# Altium footprint library Connectors.PcbLib: 120 footprints (part 5 of 8)
Each footprint in its own frame and in the unit in brackets; x right, y up, seen from the top. Pads: shape width x height; smd on the part's side, far side on the other; paste and mask are expansions set on the pad; w line width, h text height; cw(c..) or ccw(c..) is an arc to the next point about the centre after c.
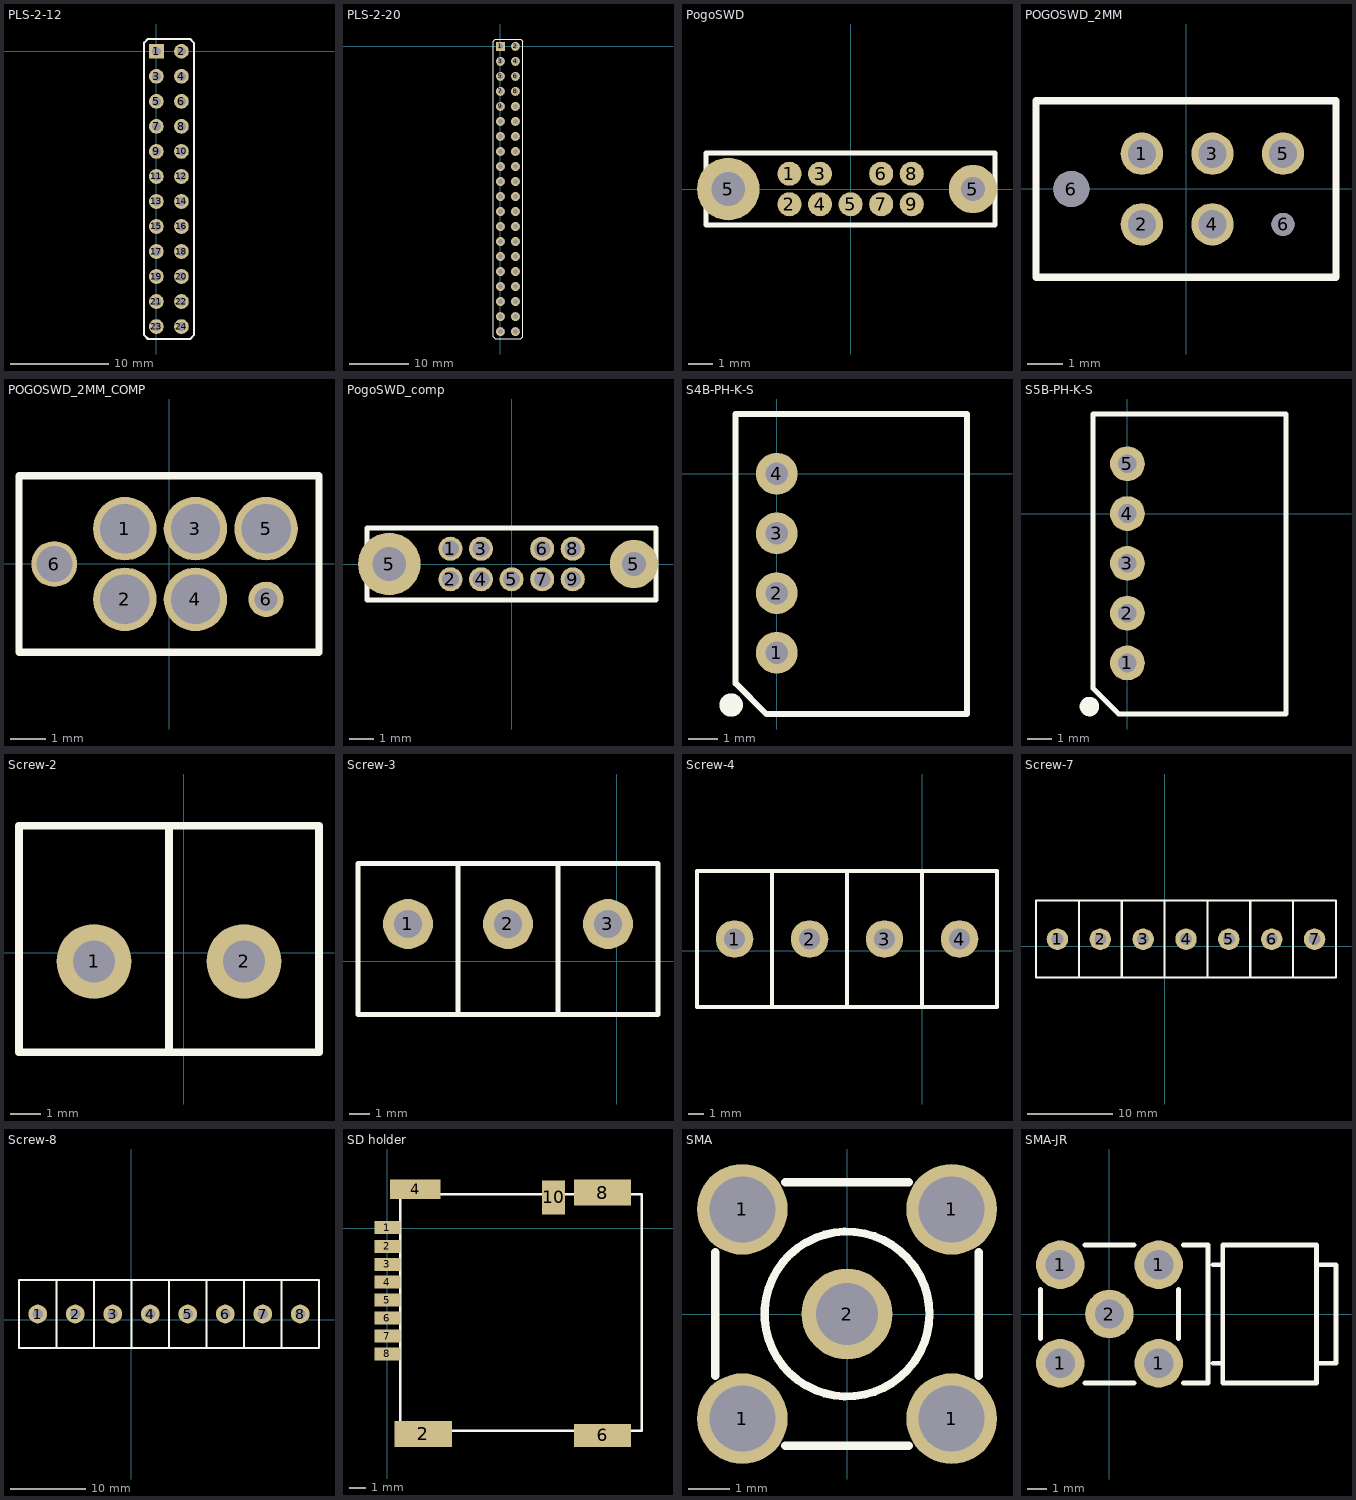
[diagram p4: the footprints below, top view; thin cyan lines are the x and y axes]

## PLS-2-12 [mm]
pads (24):
  rect 1.5x1.5 hole 0.9: 1(0,0)
  round 1.5 hole 0.9: 2(2.54,0) 3(0,-2.54) 4(2.54,-2.54) 5(0,-5.08) 6(2.54,-5.08) 7(0,-7.62) 8(2.54,-7.62) 9(0,-10.16) 10(2.54,-10.16) 11(0,-12.7) 12(2.54,-12.7) 13(0,-15.24) 14(2.54,-15.24) 15(0,-17.78) 16(2.54,-17.78) 17(0,-20.32) 18(2.54,-20.32) 19(0,-22.86) 20(2.54,-22.86) 21(0,-25.4) 22(2.54,-25.4) 23(0,-27.94) 24(2.54,-27.94)
Top Overlay:
  lines w0.2: -1.25,-28.8 -1.25,0.875 -0.875,1.25 3.425,1.25 3.81,0.865 3.81,-28.815 3.425,-29.2 -0.85,-29.2 -1.25,-28.8
3D body "User Library-PLS-1.STEP": height 8.44, standoff -3, extent 1.27,-29.21 3.81,-26.67
3D body "User Library-PLS-1.STEP": height 8.44, standoff -3, extent -1.27,-29.21 1.27,-26.67
3D body "User Library-PLS-1.STEP": height 8.44, standoff -3, extent 1.27,-26.67 3.81,-24.13
3D body "User Library-PLS-1.STEP": height 8.44, standoff -3, extent -1.27,-26.67 1.27,-24.13
3D body "User Library-PLS-1.STEP": height 8.44, standoff -3, extent 1.27,-24.13 3.81,-21.59
3D body "User Library-PLS-1.STEP": height 8.44, standoff -3, extent -1.27,-24.13 1.27,-21.59
3D body "User Library-PLS-1.STEP": height 8.44, standoff -3, extent 1.27,-21.59 3.81,-19.05
3D body "User Library-PLS-1.STEP": height 8.44, standoff -3, extent -1.27,-21.59 1.27,-19.05
3D body "User Library-PLS-1.STEP": height 8.44, standoff -3, extent 1.27,-19.05 3.81,-16.51
3D body "User Library-PLS-1.STEP": height 8.44, standoff -3, extent -1.27,-19.05 1.27,-16.51
3D body "User Library-PLS-1.STEP": height 8.44, standoff -3, extent 1.27,-16.51 3.81,-13.97
3D body "User Library-PLS-1.STEP": height 8.44, standoff -3, extent -1.27,-16.51 1.27,-13.97
3D body "User Library-PLS-1.STEP": height 8.44, standoff -3, extent 1.27,-13.97 3.81,-11.43
3D body "User Library-PLS-1.STEP": height 8.44, standoff -3, extent -1.27,-13.97 1.27,-11.43
3D body "User Library-PLS-1.STEP": height 8.44, standoff -3, extent 1.27,-11.43 3.81,-8.89
3D body "User Library-PLS-1.STEP": height 8.44, standoff -3, extent -1.27,-11.43 1.27,-8.89
3D body "User Library-PLS-1.STEP": height 8.44, standoff -3, extent 1.27,-8.89 3.81,-6.35
3D body "User Library-PLS-1.STEP": height 8.44, standoff -3, extent -1.27,-8.89 1.27,-6.35
3D body "User Library-PLS-1.STEP": height 8.44, standoff -3, extent 1.27,-6.35 3.81,-3.81
3D body "User Library-PLS-1.STEP": height 8.44, standoff -3, extent -1.27,-6.35 1.27,-3.81
3D body "User Library-PLS-1.STEP": height 8.44, standoff -3, extent 1.27,-3.81 3.81,-1.27
3D body "User Library-PLS-1.STEP": height 8.44, standoff -3, extent -1.27,-3.81 1.27,-1.27
3D body "User Library-PLS-1.STEP": height 8.44, standoff -3, extent 1.27,-1.27 3.81,1.27
3D body "User Library-PLS-1.STEP": height 8.44, standoff -3, extent -1.27,-1.27 1.27,1.27

## PLS-2-20 [mm]
pads (40):
  rect 1.5x1.5 hole 0.9: 1(0,0)
  round 1.5 hole 0.9: 2(2.54,0) 3(0,-2.54) 4(2.54,-2.54) 5(0,-5.08) 6(2.54,-5.08) 7(0,-7.62) 8(2.54,-7.62) 9(0,-10.16) 10(2.54,-10.16) 11(0,-12.7) 12(2.54,-12.7) 13(0,-15.24) 14(2.54,-15.24) 15(0,-17.78) 16(2.54,-17.78) 17(0,-20.32) 18(2.54,-20.32) 19(0,-22.86) 20(2.54,-22.86) 21(0,-25.4) 22(2.54,-25.4) 23(0,-27.94) 24(2.54,-27.94) 25(0,-30.475) 26(2.54,-30.475) 27(0,-33.015) 28(2.54,-33.015) 29(0,-35.555) 30(2.54,-35.555) 31(0,-38.095) 32(2.54,-38.095) 33(0,-40.635) 34(2.54,-40.635) 35(0,-43.175) 36(2.54,-43.175) 37(0,-45.715) 38(2.54,-45.715) 39(0,-48.255) 40(2.54,-48.255)
Top Overlay:
  lines w0.2: -1.25,-49.115 -0.85,-49.515 3.425,-49.515 3.81,-49.13 3.81,-28.815 3.81,0.865 3.425,1.25 -0.875,1.25 -1.25,0.875 -1.25,-28.8 -1.25,-49.115
3D body "User Library-PLS-1.STEP": height 8.44, standoff -3, extent 1.27,-29.21 3.81,-26.67
3D body "User Library-PLS-1.STEP": height 8.44, standoff -3, extent -1.27,-29.21 1.27,-26.67
3D body "User Library-PLS-1.STEP": height 8.44, standoff -3, extent 1.27,-26.67 3.81,-24.13
3D body "User Library-PLS-1.STEP": height 8.44, standoff -3, extent -1.27,-26.67 1.27,-24.13
3D body "User Library-PLS-1.STEP": height 8.44, standoff -3, extent 1.27,-24.13 3.81,-21.59
3D body "User Library-PLS-1.STEP": height 8.44, standoff -3, extent -1.27,-24.13 1.27,-21.59
3D body "User Library-PLS-1.STEP": height 8.44, standoff -3, extent 1.27,-21.59 3.81,-19.05
3D body "User Library-PLS-1.STEP": height 8.44, standoff -3, extent -1.27,-21.59 1.27,-19.05
3D body "User Library-PLS-1.STEP": height 8.44, standoff -3, extent 1.27,-19.05 3.81,-16.51
3D body "User Library-PLS-1.STEP": height 8.44, standoff -3, extent -1.27,-19.05 1.27,-16.51
3D body "User Library-PLS-1.STEP": height 8.44, standoff -3, extent 1.27,-16.51 3.81,-13.97
3D body "User Library-PLS-1.STEP": height 8.44, standoff -3, extent -1.27,-16.51 1.27,-13.97
3D body "User Library-PLS-1.STEP": height 8.44, standoff -3, extent 1.27,-13.97 3.81,-11.43
3D body "User Library-PLS-1.STEP": height 8.44, standoff -3, extent -1.27,-13.97 1.27,-11.43
3D body "User Library-PLS-1.STEP": height 8.44, standoff -3, extent 1.27,-11.43 3.81,-8.89
3D body "User Library-PLS-1.STEP": height 8.44, standoff -3, extent -1.27,-11.43 1.27,-8.89
3D body "User Library-PLS-1.STEP": height 8.44, standoff -3, extent 1.27,-8.89 3.81,-6.35
3D body "User Library-PLS-1.STEP": height 8.44, standoff -3, extent -1.27,-8.89 1.27,-6.35
3D body "User Library-PLS-1.STEP": height 8.44, standoff -3, extent 1.27,-6.35 3.81,-3.81
3D body "User Library-PLS-1.STEP": height 8.44, standoff -3, extent -1.27,-6.35 1.27,-3.81
3D body "User Library-PLS-1.STEP": height 8.44, standoff -3, extent 1.27,-3.81 3.81,-1.27
3D body "User Library-PLS-1.STEP": height 8.44, standoff -3, extent -1.27,-3.81 1.27,-1.27
3D body "User Library-PLS-1.STEP": height 8.44, standoff -3, extent 1.27,-1.27 3.81,1.27
3D body "User Library-PLS-1.STEP": height 8.44, standoff -3, extent -1.27,-1.27 1.27,1.27
3D body "User Library-PLS-1.STEP": height 8.44, standoff -3, extent -1.27,-31.745 1.27,-29.205
3D body "User Library-PLS-1.STEP": height 8.44, standoff -3, extent 1.27,-31.745 3.81,-29.205
3D body "User Library-PLS-1.STEP": height 8.44, standoff -3, extent -1.27,-34.285 1.27,-31.745
3D body "User Library-PLS-1.STEP": height 8.44, standoff -3, extent 1.27,-34.285 3.81,-31.745
3D body "User Library-PLS-1.STEP": height 8.44, standoff -3, extent -1.27,-36.825 1.27,-34.285
3D body "User Library-PLS-1.STEP": height 8.44, standoff -3, extent 1.27,-36.825 3.81,-34.285
3D body "User Library-PLS-1.STEP": height 8.44, standoff -3, extent -1.27,-39.365 1.27,-36.825
3D body "User Library-PLS-1.STEP": height 8.44, standoff -3, extent 1.27,-39.365 3.81,-36.825
3D body "User Library-PLS-1.STEP": height 8.44, standoff -3, extent -1.27,-41.905 1.27,-39.365
3D body "User Library-PLS-1.STEP": height 8.44, standoff -3, extent 1.27,-41.905 3.81,-39.365
3D body "User Library-PLS-1.STEP": height 8.44, standoff -3, extent -1.27,-44.445 1.27,-41.905
3D body "User Library-PLS-1.STEP": height 8.44, standoff -3, extent 1.27,-44.445 3.81,-41.905
3D body "User Library-PLS-1.STEP": height 8.44, standoff -3, extent -1.27,-46.985 1.27,-44.445
3D body "User Library-PLS-1.STEP": height 8.44, standoff -3, extent 1.27,-46.985 3.81,-44.445
3D body "User Library-PLS-1.STEP": height 8.44, standoff -3, extent -1.27,-49.525 1.27,-46.985
3D body "User Library-PLS-1.STEP": height 8.44, standoff -3, extent 1.27,-49.525 3.81,-46.985

## PogoSWD [mm]
pads (11):
  round 1 smd: 1(-2.54,0.635) 2(-2.54,-0.635) 3(-1.27,0.635) 4(-1.27,-0.635) 5(0,-0.635) 6(1.27,0.635) 7(1.27,-0.635) 8(2.54,0.635) 9(2.54,-0.635)
  round 2.6 hole 1.4 paste+0 mask+0: 5(-5.08,0)
  round 2 hole 1 paste+0 mask+0: 5(5.08,0)
Top Overlay:
  lines w0.2: -6,-1.5 6,-1.5 6,1.5 -6,1.5 -6,-1.5

## POGOSWD_2MM [mm]
pads (7):
  round 1.2 hole 0.8: 1(-1.25,1) 2(-1.25,-1) 3(0.75,1) 4(0.75,-1) 5(2.75,1)
  round 1.02 hole 1.02 unplated mask+0: 6(-3.25,0)
  round 0.65 hole 0.65 unplated mask+0: 6(2.75,-1)
Top Overlay:
  lines w0.2: -4.25,-2.5 4.25,-2.5 4.25,2.5 -4.25,2.5 -4.25,-2.5

## POGOSWD_2MM_COMP [mm]
pads (7):
  round 1.8 hole 1.4: 1(-1.25,1) 2(-1.25,-1) 3(0.75,1) 4(0.75,-1) 5(2.75,1)
  round 1.3 hole 1.02: 6(-3.25,0)
  round 1 hole 0.65: 6(2.75,-1)
Top Overlay:
  lines w0.2: -4.25,-2.5 -4.25,2.5 4.25,2.5 4.25,-2.5 -4.25,-2.5

## PogoSWD_comp [mm] "Footprint for PogoSWD board"
pads (11):
  round 1 hole 0.7: 1(-2.54,0.635) 2(-2.54,-0.635) 3(-1.27,0.635) 4(-1.27,-0.635) 5(0,-0.635) 6(1.27,0.635) 7(1.27,-0.635) 8(2.54,0.635) 9(2.54,-0.635)
  round 2.6 hole 1.4 paste+0 mask+0: 5(-5.08,0)
  round 2 hole 1 paste+0 mask+0: 5(5.08,0)
Top Overlay:
  lines w0.2: -6,-1.5 -6,1.5 6,1.5 6,-1.5 -6,-1.5

## S4B-PH-K-S [mm] "JST S4B-PH-K-S connector"
pads (4):
  round 1.4 hole 0.75: 1(0,-6) 2(0,-4) 3(0,-2) 4(0,0)
Top Overlay:
  circle w0.5: c-1.525,-7.75 r0.141
  lines w0.2: -1.375,-7.025 -1.375,2 6.375,2 6.375,-8.05 -0.35,-8.05 -1.375,-7.025
3D body "S4B-PH-K-S.STEP": height 4.8, standoff -3.4, extent -1.325,-7.95 6.275,1.95

## S5B-PH-K-S [mm] "JST S5B-PH-K-S connector"
pads (5):
  round 1.4 hole 0.75: 1(0,-6) 2(0,-4) 3(0,-2) 4(0,0) 5(0,2)
Top Overlay:
  circle w0.5: c-1.525,-7.75 r0.141
  lines w0.2: -1.375,-7.025 -1.375,4 6.375,4 6.375,-8.05 -0.35,-8.05 -1.375,-7.025
3D body "S5B-PH-K-S.STEP": height 4.8, standoff -3.4, extent -1.3,-7.95 6.3,3.95

## Screw-2 [mm]
pads (2):
  round 2.5 hole 1.4: 1(-3,-0.3) 2(2,-0.3)
Top Overlay:
  lines w0.254: -0.5,-3.325 -0.5,4.2 ; -5.5,-3.325 -5.5,4.225 4.5,4.225 4.5,-3.325 -5.5,-3.325
3D body "User Library-Terminal-Screw-3A-2way.STEP": height 10, standoff -3, extent -6.075,-3.3 4.525,4.3

## Screw-3 [mm]
pads (3):
  round 2.5 hole 1.4: 1(-10.45,1.875) 2(-5.45,1.875) 3(-0.45,1.875)
Top Overlay:
  lines w0.254: -7.95,-2.625 -7.95,4.9 ; -2.95,-2.6 -2.95,4.9 ; -12.95,-2.65 2.05,-2.65 2.05,4.9 -12.95,4.9 -12.95,-2.65
3D body "User Library-Terminal-Screw-3A-3way.step": height 10, standoff -3, extent -12.95,-2.7 2.65,4.9

## Screw-4 [mm]
pads (4):
  round 2.5 hole 1.4: 1(-12.5,0.8) 2(-7.5,0.8) 3(-2.5,0.8) 4(2.5,0.8)
Top Overlay:
  lines w0.254: -10,-3.7 -10,5.3 ; 0,-3.7 0,5.3 ; -5,-3.725 -15,-3.725 -15,5.325 -5,5.325 ; -5,-3.725 -5,5.325 ; -5,-3.725 5,-3.725 5,5.325 -5,5.325 ; -5,-3.725 -5,5.325
3D body "User Library-2 Way PCB Screw Terminal Block 5mm.STEP": height 15.2, standoff -3.5, extent -5,-3.7 5,5.3
3D body "User Library-2 Way PCB Screw Terminal Block 5mm.STEP": height 15.2, standoff -3.5, extent -15,-3.7 -5,5.3

## Screw-7 [mm]
pads (7):
  round 2.5 hole 1.4: 1(-12.5,0.8) 2(-7.5,0.8) 3(-2.5,0.8) 4(2.5,0.8) 5(7.5,0.8) 6(12.5,0.8) 7(17.5,0.8)
Top Overlay:
  lines w0.254: -10,-3.675 -10,5.275 ; -5,-3.65 -5,5.3 ; 5,5.275 5,-3.675 ; 10,-3.675 10,5.275 ; 10,-3.65 10,5.3 ; 15,-3.65 15,5.3 ; 0,-3.675 0,5.325 ; 0,-3.675 -15,-3.675 -15,5.325 0,5.325 ; 0,-3.675 0,5.325 ; 0,-3.675 15,-3.675 15,5.325 0,5.325 ; 5,-3.675 5,5.325 20,5.325 20,-3.675 5,-3.675
3D body "User Library-2 Way PCB Screw Terminal Block 5mm.STEP": height 15.2, standoff -3.5, extent 10,-3.7 20,5.3
3D body "User Library-2 Way PCB Screw Terminal Block 5mm.STEP": height 15.2, standoff -3.5, extent 0,-3.7 10,5.3
3D body "User Library-3 Way PCB Screw Terminal Block 5mm.STEP": height 15.2, standoff -3.5, extent -14.975,-3.675 0.025,5.325

## Screw-8 [mm]
pads (8):
  round 2.5 hole 1.4: 1(-12.5,0.8) 2(-7.5,0.8) 3(-2.5,0.8) 4(2.5,0.8) 5(7.5,0.8) 6(12.5,0.8) 7(17.5,0.8) 8(22.5,0.8)
Top Overlay:
  lines w0.254: -10,-3.7 -10,5.3 ; 0,-3.7 0,5.3 ; 10,-3.7 10,5.3 ; 20,-3.7 20,5.3 ; -5,-3.725 -15,-3.725 -15,5.325 -5,5.325 ; -5,-3.725 -5,5.325 ; -5,-3.725 5,-3.725 ; -5,-3.725 -5,5.325 ; -5,5.325 5,5.325 ; 5,-3.725 5,5.325 ; 5,-3.725 15,-3.725 ; 5,-3.725 5,5.325 ; 5,5.325 15,5.325 ; 15,-3.725 15,5.325 ; 15,-3.725 25,-3.725 25,5.325 15,5.325 ; 15,-3.725 15,5.325
3D body "User Library-2 Way PCB Screw Terminal Block 5mm.STEP": height 15.2, standoff -3.5, extent -15,-3.7 -5,5.3
3D body "User Library-2 Way PCB Screw Terminal Block 5mm.STEP": height 15.2, standoff -3.5, extent -5,-3.7 5,5.3
3D body "User Library-2 Way PCB Screw Terminal Block 5mm.STEP": height 15.2, standoff -3.5, extent 5,-3.7 15,5.3
3D body "User Library-2 Way PCB Screw Terminal Block 5mm.STEP": height 15.2, standoff -3.5, extent 15,-3.7 25,5.3

## SD holder [mm]
pads (13):
  rect 1.6x0.8 smd: 1(0,0.05) 2(0,-1.1) 3(0,-2.2) 4(0,-3.3) 5(0,-4.4) 6(0,-5.5) 7(0,-6.6) 8(0,-7.7)
  rect 3.5x1.6 smd: 2(2.2,-12.6) 8(13.2,2.2)
  rect 3.1x1.2 smd: 4(1.7,2.4)
  rect 3.5x1.4 smd: 6(13.2,-12.7)
  rect 1.4x2.1 smd: 10(10.2,1.9)
Top Overlay:
  lines w0.15: 0.8,-12.4 0.8,2.1 15.6,2.1 15.6,-12.4 0.8,-12.4

## SMA [mm] "SMA socket on board"
pads (5):
  round 2.2 hole 1.6 paste+0 mask+0: 1(-2.54,-2.54) 1(-2.54,2.54) 1(2.54,-2.54) 1(2.54,2.54)
  round 2.2 hole 1.5 paste+0 mask+0: 2(0,0)
Top Overlay:
  circle w0.2: c0,0 r2
  lines w0.2: -3.2,-1.5 -3.2,1.5 ; -1.5,-3.2 1.5,-3.2 ; -1.5,3.2 1.5,3.2 ; 3.2,-1.5 3.2,1.5
3D body "c-5-1814832-1-b-3d.step": height 9.6, standoff -3.9, extent -3.2,-3.2 3.2,3.2

## SMA-JR [mm]
pads (5):
  round 2.5 hole 1.5: 1(-2.54,-2.54) 1(-2.54,2.54) 1(2.54,-2.54) 1(2.54,2.54) 2(0,0)
Top Overlay:
  lines w0.254: -3.556,-1.27 -3.556,1.27 ; -1.27,-3.556 1.27,-3.556 ; -1.27,3.556 1.27,3.556 ; 3.556,-1.27 3.556,1.27 ; 3.81,-3.556 5.08,-3.556 5.08,3.556 3.81,3.556 ; 5.334,-2.54 5.842,-2.54 ; 5.334,2.54 5.842,2.54 ; 10.668,-2.54 11.684,-2.54 11.684,2.54 10.668,2.54 ; 5.842,-3.556 5.842,3.556 10.668,3.556 10.668,-3.556 5.842,-3.556